# Altium footprint library IntLib.PcbLib: 221 footprints (part 10 of 14)
Each footprint in its own frame and in the unit in brackets; x right, y up, seen from the top. Pads: shape width x height; smd on the part's side, far side on the other; paste and mask are expansions set on the pad; w line width, h text height; cw(c..) or ccw(c..) is an arc to the next point about the centre after c.
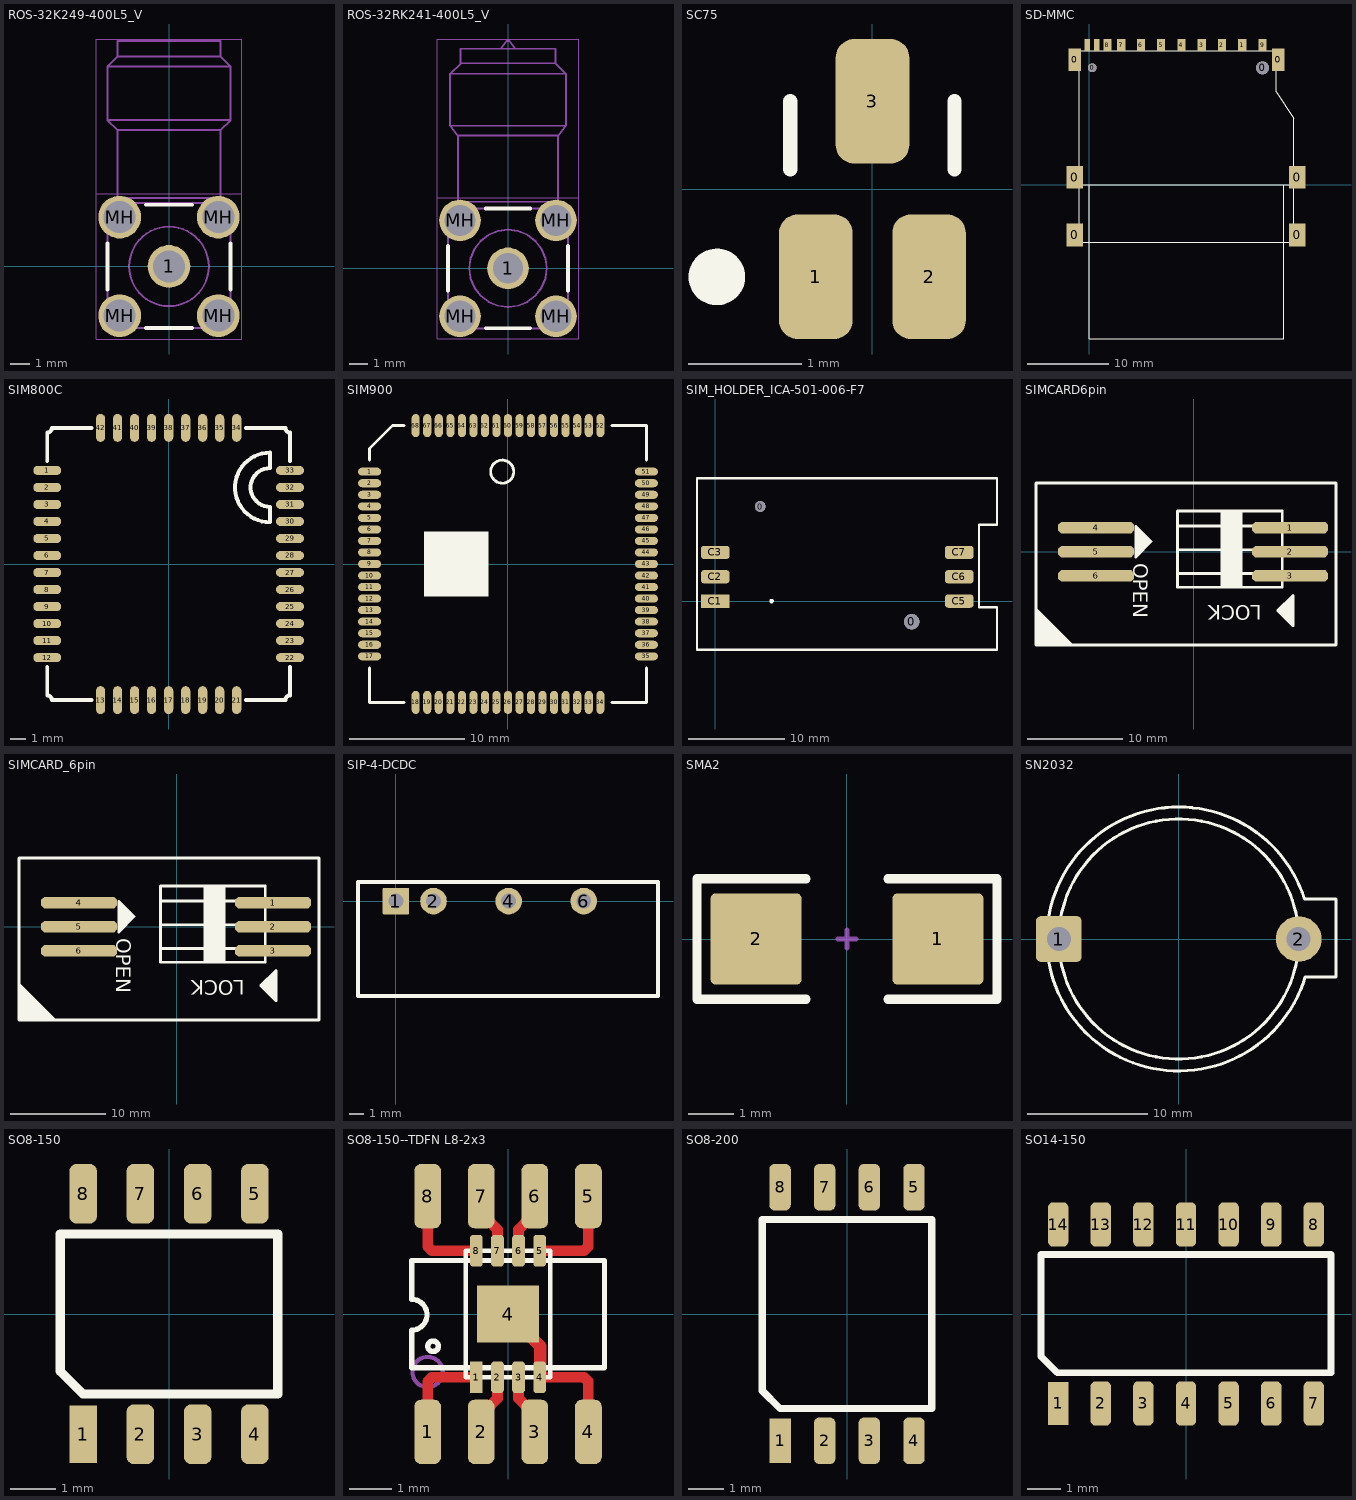
[diagram p9: the footprints below, top view; thin cyan lines are the x and y axes]

## ROS-32K249-400L5_V [mm] "SMA Right Angle Jack, 14.8x6.35x9.7mm, Rosenberger Recommended"
height 9.7
pads (5):
  round 2.2 hole 1.65: 1(0,0) MH(-2.54,-2.54) MH(-2.54,2.54) MH(2.54,-2.54) MH(2.54,2.54)
Top Overlay:
  lines w0.2: -3.175,-1.181 -3.175,1.181 ; -1.181,-3.175 1.181,-3.175 ; -1.181,3.175 1.181,3.175 ; 3.175,-1.181 3.175,1.181
Mechanical 13:
  circle w0.1: c0,0 r0.635
  circle w0.1: c0,0 r2.05
  lines w0.1: -3.175,-1.708 -2.161,-1.708 -2.02,-1.874 -1.866,-2.028 -1.7,-2.17 -1.7,-3.183 ; -3.175,1.708 -2.161,1.708 -2.02,1.874 -1.866,2.028 -1.7,2.17 -1.7,3.183 -2.9,3.183 -3.175,2.908 -3.175,-2.908 -2.9,-3.183 ; -2.9,-3.183 2.9,-3.183 ; 1.7,-3.183 1.7,-2.17 1.866,-2.028 2.02,-1.874 2.161,-1.708 3.175,-1.708 ; 2.9,-3.183 3.175,-2.908 3.175,2.908 2.9,3.183 1.7,3.183 1.7,2.17 1.866,2.028 2.02,1.874 2.161,1.708 3.175,1.708 ; -3.175,7.542 -3.175,10.292 ; -3.175,7.542 3.175,7.542 ; -3.175,7.542 -2.65,7.017 ; -3.175,10.292 3.175,10.292 ; -3.175,10.292 -2.65,10.817 ; -2.65,3.517 -2.65,7.017 ; -2.65,3.517 2.65,3.517 ; -2.65,3.517 -2.9,3.267 2.9,3.267 2.65,3.517 ; -2.65,7.017 2.65,7.017 ; -2.65,10.817 2.65,10.817 ; -2.65,10.817 -2.65,11.617 2.65,11.617 2.65,10.817 ; 2.65,3.517 2.65,7.017 ; 2.65,7.017 3.175,7.542 ; 2.65,10.817 3.175,10.292 ; 3.175,7.542 3.175,10.292 ; -3.04,-3.048 -2.04,-3.048 -2.04,-2.048 -3.04,-2.048 -3.04,-3.048 ; -3.04,2.032 -3.04,3.032 -2.04,3.032 -2.04,2.032 -3.04,2.032 ; 2.04,-3.048 2.04,-2.048 3.04,-2.048 3.04,-3.048 2.04,-3.048 ; 2.04,2.032 3.04,2.032 3.04,3.032 2.04,3.032 2.04,2.032
Mechanical 15:
  lines w0.05: -3.74,3.74 3.74,3.74 ; -3.74,-3.74 3.74,-3.74 3.74,11.717 -3.74,11.717 -3.74,-3.74
  lines w0.1: -0.5,0 0.5,0 ; 0,-0.5 0,0.5
3D body: height 9.7, standoff -4, extent -3.175,-3.183 3.175,11.617

## ROS-32RK241-400L5_V [mm] "Reverse-SMA Straight Jack, 15.215x6.35x9.7mm, Rosenberger Recommended"
height 9.7
pads (5):
  round 2.2 hole 1.6: 1(0,0)
  round 2.2 hole 1.65: MH(-2.54,-2.54) MH(-2.54,2.54) MH(2.54,-2.54) MH(2.54,2.54)
Top Overlay:
  lines w0.2: -3.175,-1.181 -3.175,1.181 ; -1.181,-3.175 1.181,-3.175 ; -1.181,3.175 1.181,3.175 ; 3.175,-1.181 3.175,1.181
Mechanical 13:
  circle w0.1: c0,0 r0.635
  lines w0.1: -3.175,-2.9 -3.175,2.9 -3.086,2.995 -2.994,3.086 ; -3.175,-2.9 -3.086,-2.994 -2.995,-3.086 -2.9,-3.175 2.905,-3.175 ; -3.175,-1.7 -2.161,-1.7 ; -3.175,1.7 -2.162,1.7 ; -2.9,3.175 -2.994,3.086 ; -2.65,4.036 -2.65,7.02 -2.65,3.525 ; -2.161,-1.7 -2.02,-1.866 -1.866,-2.02 -1.7,-2.162 ; -2.162,1.7 -2.02,1.866 -1.866,2.02 -1.7,2.161 ; -1.7,-3.175 -1.7,-2.162 ; -1.7,2.161 -1.7,3.175 ; -0.375,11.625 -0.071,12.04 0.071,12.04 0.375,11.625 ; 1.7,-2.161 1.866,-2.02 2.02,-1.866 2.162,-1.7 ; 1.7,2.162 1.866,2.02 2.02,1.866 2.161,1.7 ; 1.7,-3.175 1.7,-2.161 ; 1.7,2.162 1.7,3.175 ; 2.162,-1.7 3.175,-1.7 ; 2.161,1.7 3.175,1.7 ; 2.65,4.036 2.65,7.02 2.65,3.525 ; 2.9,-3.175 2.994,-3.086 3.086,-2.995 3.175,-2.9 ; 3.175,-2.905 3.175,2.9 ; 3.175,2.9 3.086,2.994 2.995,3.086 ; -3.067,7.55 -3.067,10.3 ; -3.067,7.55 -2.65,7.025 ; -3.067,7.55 3.067,7.55 ; -3.067,7.55 -3.067,10.3 ; -3.067,7.55 -2.65,7.025 ; -3.067,10.3 -2.512,10.825 -3.067,10.3 ; -3.067,10.3 3.067,10.3 ; -2.995,3.086 -2.9,3.175 ; -2.9,3.175 2.9,3.175 ; -2.9,3.175 -2.65,3.525 ; -2.65,3.525 2.65,3.525 ; -2.65,7.025 2.65,7.025 ; -2.512,10.855 -2.512,11.625 ; -2.512,10.855 2.512,10.855 ; -2.512,10.855 -2.512,11.625 ; -2.512,11.625 2.511,11.625 -2.512,11.625 ; 2.512,10.855 3.067,10.3 ; 2.512,10.855 2.512,11.625 2.512,10.855 ; 2.512,10.855 3.067,10.3 ; 2.65,3.525 2.9,3.175 ; 2.65,7.025 3.067,7.55 ; 2.65,7.025 3.067,7.55 ; 2.9,3.175 2.995,3.086 ; 2.9,3.175 2.995,3.086 ; 3.067,7.55 3.067,10.3 ; 3.067,7.55 3.067,10.3 ; -3.04,-3.04 -3.04,-2.04 -2.04,-2.04 -2.04,-3.04 -3.04,-3.04 ; -3.04,2.04 -3.04,3.04 -2.04,3.04 -2.04,2.04 -3.04,2.04 ; -2.05,0 -1.98,-0.53 -1.775,-1.025 -1.45,-1.449 -1.025,-1.775 -0.531,-1.98 0,-2.05 0.53,-1.98 1.025,-1.775 1.449,-1.45 1.775,-1.025 1.98,-0.531 2.05,0 1.98,0.53 1.775,1.025 1.45,1.449 1.025,1.775 0.531,1.98 0,2.05 -0.53,1.98 -1.025,1.775 -1.449,1.45 -1.775,1.025 -1.98,0.531 -2.05,0 ; 2.04,-3.04 2.04,-2.04 3.04,-2.04 3.04,-3.04 2.04,-3.04 ; 2.04,2.04 2.04,3.04 3.04,3.04 3.04,2.04 2.04,2.04
Mechanical 15:
  lines w0.05: -3.74,3.74 3.74,3.74 ; -3.74,-3.74 -3.74,12.14 3.74,12.14 3.74,-3.74 -3.74,-3.74
3D body: height 9.7, standoff -4, extent -3.175,-3.175 3.175,12.04

## SC75 [mm] "SOT-416/SC-90/SC-75; 3 Leads; Body 1.8 x 1.8 mm Pitch 0.5mm"
height 0.9
pads (3):
  rrect50% 0.65x1.1 smd: 1(-0.5,-0.775) 2(0.5,-0.775) 3(0,0.775)
Top Overlay:
  circle w0.25: c-1.375,-0.777 r0.125
  lines w0.127: -0.725,0.175 -0.725,0.775 ; 0.725,0.175 0.725,0.775
3D body: height 0.7, standoff -0.03, extent -0.8,-0.793 0.8,0.794

## SD-MMC [mm]
pads (19):
  rect 2x2.8 smd: 0(-1.773,-6.165) 0(-1.773,0.947) 0(25.652,-6.165) 0(25.652,0.947)
  rect 1.5x2.8 smd: 0(-1.773,15.447) 0(23.327,15.447)
  round 1.1 hole 1.1: 0(0.377,14.447)
  round 1.6 hole 1.6: 0(21.377,14.447)
  rect 1x1.5 smd: 1(18.877,17.247) 2(16.377,17.247) 3(13.877,17.247) 4(11.377,17.247) 5(8.877,17.247) 6(6.377,17.247) 7(3.952,17.247) 8(2.252,17.247) 9(21.377,17.247)
  rect 0.7x1.5 smd: 10(0.952,17.247) 11(-0.248,17.247)
Top Overlay:
  lines w0.1: 0.002,-0.003 0.002,-19.003 24.002,-19.003 24.002,-0.003 ; -1.248,0.022 -1.248,-7.09 25.252,-7.09 25.252,0.022 ; -1.248,0.022 -1.248,16.522 23.052,16.522 23.052,11.522 25.252,8.222 25.252,0.022 ; -1.248,0.022 25.252,0.022

## SIM800C [mm]
pads (42):
  oval 1.8x0.6 smd: 1(-7.85,6.05) 2(-7.85,4.95) 3(-7.85,3.85) 4(-7.85,2.75) 5(-7.85,1.65) 6(-7.85,0.55) 7(-7.85,-0.55) 8(-7.85,-1.65) 9(-7.85,-2.75) 10(-7.85,-3.85) 11(-7.85,-4.95) 12(-7.85,-6.05) 22(7.85,-6.05) 23(7.85,-4.95) 24(7.85,-3.85) 25(7.85,-2.75) 26(7.85,-1.65) 27(7.85,-0.55) 28(7.85,0.55) 29(7.85,1.65) 30(7.85,2.75) 31(7.85,3.85) 32(7.85,4.95) 33(7.85,6.05)
  oval 0.6x1.8 smd: 13(-4.4,-8.8) 14(-3.3,-8.8) 15(-2.2,-8.8) 16(-1.1,-8.8) 17(0,-8.8) 18(1.1,-8.8) 19(2.2,-8.8) 20(3.3,-8.8) 21(4.4,-8.8) 34(4.4,8.8) 35(3.3,8.8) 36(2.2,8.8) 37(1.1,8.8) 38(0,8.8) 39(-1.1,8.8) 40(-2.2,8.8) 41(-3.3,8.8) 42(-4.4,8.8)
Top Overlay:
  lines w0.254: -7.85,-6.65 -7.85,-8.5 cw(c-7.85,-8.8) -7.55,-8.8 -5,-8.8 ; -7.85,6.65 -7.85,8.5 ccw(c-7.85,8.8) -7.55,8.8 -5,8.8 ; 5,-8.8 7.55,-8.8 cw(c7.85,-8.8) 7.85,-8.5 7.85,-6.65 ; 5,8.8 7.55,8.8 ccw(c7.85,8.8) 7.85,8.5 7.85,6.65 ; 6.55,2.7 cw(c6.55,4.95) 6.55,7.2 6.55,6.2 ccw(c6.55,4.95) 6.55,3.7 6.55,2.7
3D body: height 2.37, standoff 0.03, extent -7.85,-8.8 7.85,8.8

## SIM900 [mm]
height 10.95
pads (68):
  oval 2x0.7 smd: 1(-12,8) 2(-12,7) 3(-12,6) 4(-12,5) 5(-12,4) 6(-12,3) 7(-12,2) 8(-12,1) 9(-12,0) 10(-12,-1) 11(-12,-2) 12(-12,-3) 13(-12,-4) 14(-12,-5) 15(-12,-6) 16(-12,-7) 17(-12,-8) 35(12,-8) 36(12,-7) 37(12,-6) 38(12,-5) 39(12,-4) 40(12,-3) 41(12,-2) 42(12,-1) 43(12,0) 44(12,1) 45(12,2) 46(12,3) 47(12,4) 48(12,5) 49(12,6) 50(12,7) 51(12,8)
  oval 0.7x2 smd: 18(-8,-12) 19(-7,-12) 20(-6,-12) 21(-5,-12) 22(-4,-12) 23(-3,-12) 24(-2,-12) 25(-1,-12) 26(0,-12) 27(1,-12) 28(2,-12) 29(3,-12) 30(4,-12) 31(5,-12) 32(6,-12) 33(7,-12) 34(8,-12) 52(8,12) 53(7,12) 54(6,12) 55(5,12) 56(4,12) 57(3,12) 58(2,12) 59(1,12) 60(0,12) 61(-1,12) 62(-2,12) 63(-3,12) 64(-4,12) 65(-5,12) 66(-6,12) 67(-7,12) 68(-8,12)
Top Overlay:
  circle w0.254: c-0.5,8 r1
  rectangle: -7.3,-2.8 -1.7,2.8
  lines w0.254: -12,-9 -12,-12 -9,-12 ; -12,9 -12,10 -10,12 -9,12 ; 9,-12 12,-12 12,-9 ; 9,12 12,12 12,9
3D body: height 3.02, standoff 0, extent -12,-12 12,12

## SIM_HOLDER_ICA-501-006-F7 [mm]
height 2.2
pads (8):
  round 1.1 hole 1.1 unplated: 0(4.699,9.881)
  round 1.6 hole 1.6 unplated: 0(20.523,-2.159)
  rect 3x1.4 smd: C1(0,0)
  rrect50% 3x1.4 smd: C2(0,2.54) C3(0,5.08) C5(25.5,0) C6(25.5,2.54) C7(25.5,5.08)
Top Overlay:
  circle w0.254: c5.888,0 r0.112
  lines w0.254: -1.905,-5.08 -0.432,-5.08 29.439,-5.08 29.439,-0.66 27.559,-0.66 27.559,7.976 29.439,7.976 29.439,12.827 -1.905,12.827 -1.905,-5.08
3D body: height 2.6, standoff -0.7, extent -0.61,-4.79 29.03,12.41

## SIMCARD6pin [mm]
pads (6):
  oct 8x1.2 smd: 1(10.138,2.54) 2(10.138,0) 3(10.138,-2.54) 4(-10.238,2.54) 5(-10.238,0) 6(-10.238,-2.54)
Top Overlay:
  rectangle: 2.829,-3.79 5.13,4.262
  region: -16.562,-6.019 -12.786,-9.795 -16.562,-9.795
  region: 10.45,-4.585 10.45,-7.785 8.85,-6.185
  lines w0.254: -16.562,-6.019 -12.786,-9.795
  lines w0.3: -5.874,2.214 -5.874,-0.087 -4.823,0.963 -4.823,1.113 -5.724,2.014 ; -5.724,0.413 -5.724,1.864 ; -5.524,1.614 -5.524,0.563 -5.474,0.513 ; -5.373,0.663 -5.073,0.963 ; -5.373,1.564 -5.373,0.963 -5.273,0.863 ; -5.223,1.364 -5.223,1.063 -5.173,1.013 ; -5.023,1.113 -5.023,1.163 ; -1.689,-2.287 9.311,-2.287 ; -1.689,0.213 9.311,0.213 ; -1.689,2.714 9.311,2.714 ; -16.562,-9.795 -16.562,7.213 14.962,7.213 14.962,-9.795 -16.562,-9.795 ; -6.074,-0.537 -6.074,2.664 -4.473,1.063 -6.074,-0.537 ; -1.689,-3.738 9.311,-3.738 9.311,4.262 -1.689,4.262 -1.689,-3.738 ; 8.85,-6.185 10.45,-7.785 10.45,-4.585 8.85,-6.185
  text "OPEN" at -6.362,-1.211 h1.52
  text "LOCK" at 7.138,-5.611 h1.52
3D body: height 2.35, standoff -0.7, extent -16.628,-9.87 13.072,7.33

## SIMCARD_6pin [mm]
pads (6):
  oct 8x1.2 smd: 1(10.138,2.54) 2(10.138,0) 3(10.138,-2.54) 4(-10.238,2.54) 5(-10.238,0) 6(-10.238,-2.54)
Top Overlay:
  rectangle: 2.829,-3.79 5.13,4.262
  region: 10.45,-4.585 10.45,-7.785 8.85,-6.185
  region: -16.562,-6.019 -12.786,-9.795 -16.562,-9.795
  lines w0.254: -16.562,-6.019 -12.786,-9.795
  lines w0.3: -5.874,2.214 -5.874,-0.087 -4.823,0.963 -4.823,1.113 -5.724,2.014 ; -5.724,0.413 -5.724,1.864 ; -5.524,1.614 -5.524,0.563 -5.474,0.513 ; -5.373,0.663 -5.073,0.963 ; -5.373,1.564 -5.373,0.963 -5.273,0.863 ; -5.223,1.364 -5.223,1.063 -5.173,1.013 ; -5.023,1.113 -5.023,1.163 ; -1.689,-2.287 9.311,-2.287 ; -1.689,0.213 9.311,0.213 ; -1.689,2.714 9.311,2.714 ; -16.562,-9.795 14.962,-9.795 14.962,7.213 -16.562,7.213 -16.562,-9.795 ; -6.074,-0.537 -4.473,1.063 -6.074,2.664 -6.074,-0.537 ; -1.689,-3.738 -1.689,4.262 9.311,4.262 9.311,-3.738 -1.689,-3.738 ; 8.85,-6.185 10.45,-4.585 10.45,-7.785 8.85,-6.185
  text "LOCK" at 7.138,-5.611 h1.52
  text "OPEN" at -6.362,-1.211 h1.52
3D body: height 2.6, standoff -0.7, extent -16.41,-9.87 13.23,7.33

## SIP-4-DCDC [mm] "SIP-4 DC/DC"
height 20
pads (4):
  rrect10% 1.8x1.8 hole 1: 1(0,0)
  round 1.8 hole 1: 2(2.54,0) 4(7.62,0) 6(12.7,0)
Top Overlay:
  lines w0.254: -2.565,-6.426 -2.565,1.295 17.729,1.295 17.729,-6.426 -2.565,-6.426
3D body: height 10.16, standoff -4.1, extent -2.256,-6.085 17.394,0.965

## SMA2 [mm] "DO-214-AC/SMA; 2 C-Bend Leads; Body 5.3 x 2.6 mm, inc. leads (LxW)"
height 2.34
pads (2):
  rrect10% 2x2 smd: 1(2,0) 2(-2,0)
Top Overlay:
  lines w0.2: -0.9,-1.325 -3.3,-1.325 -3.3,1.325 -0.9,1.325 ; 0.9,-1.325 3.3,-1.325 3.3,1.325 0.9,1.325
Mechanical 3:
  lines w0.1: -0.2,0 0.2,0 ; 0,-0.2 0,0.2
3D body: height 2.08, standoff 0, extent -2.517,-1.4 2.317,1.305

## SN2032 [mm] "D=20.0mm H=8.5mm"
height 8.5
pads (2):
  rrect20% 3.8x3.8 hole 2: 1(-10,0)
  round 3.8 hole 2: 2(10,0)
Top Overlay:
  circle w0.254: c0,0 r10
  lines w0.254: 10.482,3.335 ccw(c0,0) 10.526,-3.196 ; 10.49,3.327 13.106,3.327 13.106,-3.175 10.541,-3.175
3D body: height 7, standoff 3.8, extent -13.226,-9.992 6.774,10.008
3D body: height 8.67, standoff -3.5, extent -14.731,-11.449 12.7,11.551

## SO8-150 [mil]
pads (8):
  rect 24x50 smd mask+4: 1(-75,-105)
  rrect50% 24x52 smd mask+4: 2(-25,-105) 3(25,-105) 4(75,-105) 5(75,105) 6(25,105) 7(-25,105) 8(-75,105)
Top Overlay:
  lines w8: -95.01,-49.99 -95.01,70 95,70 95,-70 -75,-70 -95.01,-49.99
3D body: height 67, standoff 0, extent -95.01,-122.01 94.99,121.99

## SO8-150--TDFN L8-2x3 [mm]
pads (17):
  rrect50% 0.635x1.524 smd: 1(-1.905,-2.794) 2(-0.635,-2.794) 3(0.635,-2.794) 4(1.905,-2.794) 5(1.905,2.794) 6(0.635,2.794) 7(-0.635,2.794) 8(-1.905,2.794)
  rect 0.3x0.75 smd: 1(-0.75,-1.5)
  rrect50% 0.3x0.75 smd: 2(-0.25,-1.5) 3(0.25,-1.5) 4(0.75,-1.5) 5(0.75,1.5) 6(0.25,1.5) 7(-0.25,1.5) 8(-0.75,1.5)
  rect 1.46x1.36 smd: 4(0,0)
Top Layer:
  lines w0.254: -1.9,-2.2 -1.9,-1.6 -1.8,-1.5 ; -1.9,2.2 -1.9,1.6 -1.8,1.5 ; -1.75,-1.5 -0.75,-1.5 ; -1.75,1.5 -0.75,1.5 ; -0.5,-2.25 -0.25,-2 -0.25,-1.5 ; -0.5,2.25 -0.25,2 -0.25,1.5 ; 0.25,-1.5 0.25,-2 0.5,-2.25 ; 0.25,1.5 0.25,2 0.5,2.25 ; 0.75,-1.5 1.754,-1.5 1.8,-1.5 1.9,-1.6 1.9,-2.2 ; 0.75,1.5 1.754,1.5 1.8,1.5 1.9,1.6 1.9,2.2
  lines w0.3: 0,0 0.762,-0.762 0.762,-1.5
Top Overlay:
  circle w0.127: c-1.776,-0.765 r0.125
  lines w0.1: -1,-1.5 1,-1.5 ; -1,-1.5 -1,1.5 1,1.5 1,-1.5 ; -1,-1.5 1,-1.5
  lines w0.127: -2.286,0.349 cw(c-2.286,-0.017) -2.286,-0.384 -2.286,-1.273 2.286,-1.273 2.286,1.267 -2.286,1.267 -2.286,0.378
Mechanical 13:
  circle w0.1: c-1.905,-1.375 r0.359
3D body: height 1.7, standoff 0, extent -2.413,-3.099 2.413,3.099
3D body: height 0.76, standoff 0, extent -1,-1.5 1,1.5
3D body: height 0.76, standoff 0, extent -0.75,-1.25 -0.551,-1.05

## SO8-200 [mil]
pads (8):
  rect 24x50 smd mask+4: 1(-75,-142)
  rrect50% 24x52 smd mask+4: 2(-25,-142) 3(25,-142) 4(75,-142) 5(75,142) 6(25,142) 7(-25,142) 8(-75,142)
Top Overlay:
  lines w8: -95,-86 -95,106 95,106 95,-106 -75,-106 -95,-86
3D body: height 67, standoff 0, extent -95,-161 95,161

## SO14-150 [mil]
pads (14):
  rect 24x50 smd mask+4: 1(-150,-105)
  rrect50% 24x52 smd mask+4: 2(-100,-105) 3(-50,-105) 4(0,-105) 5(50,-105) 6(100,-105) 7(150,-105) 8(150,105) 9(100,105) 10(50,105) 11(0,105) 12(-50,105) 13(-100,105) 14(-150,105)
Top Overlay:
  lines w8: -170,-50 -151.1,-68.9 170,-68.9 170,70 -170,70 -170,-50
3D body: height 67, standoff 0, extent -170,-122 170,122